# Altium footprint library hphonglib.PcbLib: 1250 footprints (part 54 of 79)
Each footprint in its own frame and in the unit in brackets; x right, y up, seen from the top. Pads: shape width x height; smd on the part's side, far side on the other; paste and mask are expansions set on the pad; w line width, h text height; cw(c..) or ccw(c..) is an arc to the next point about the centre after c.
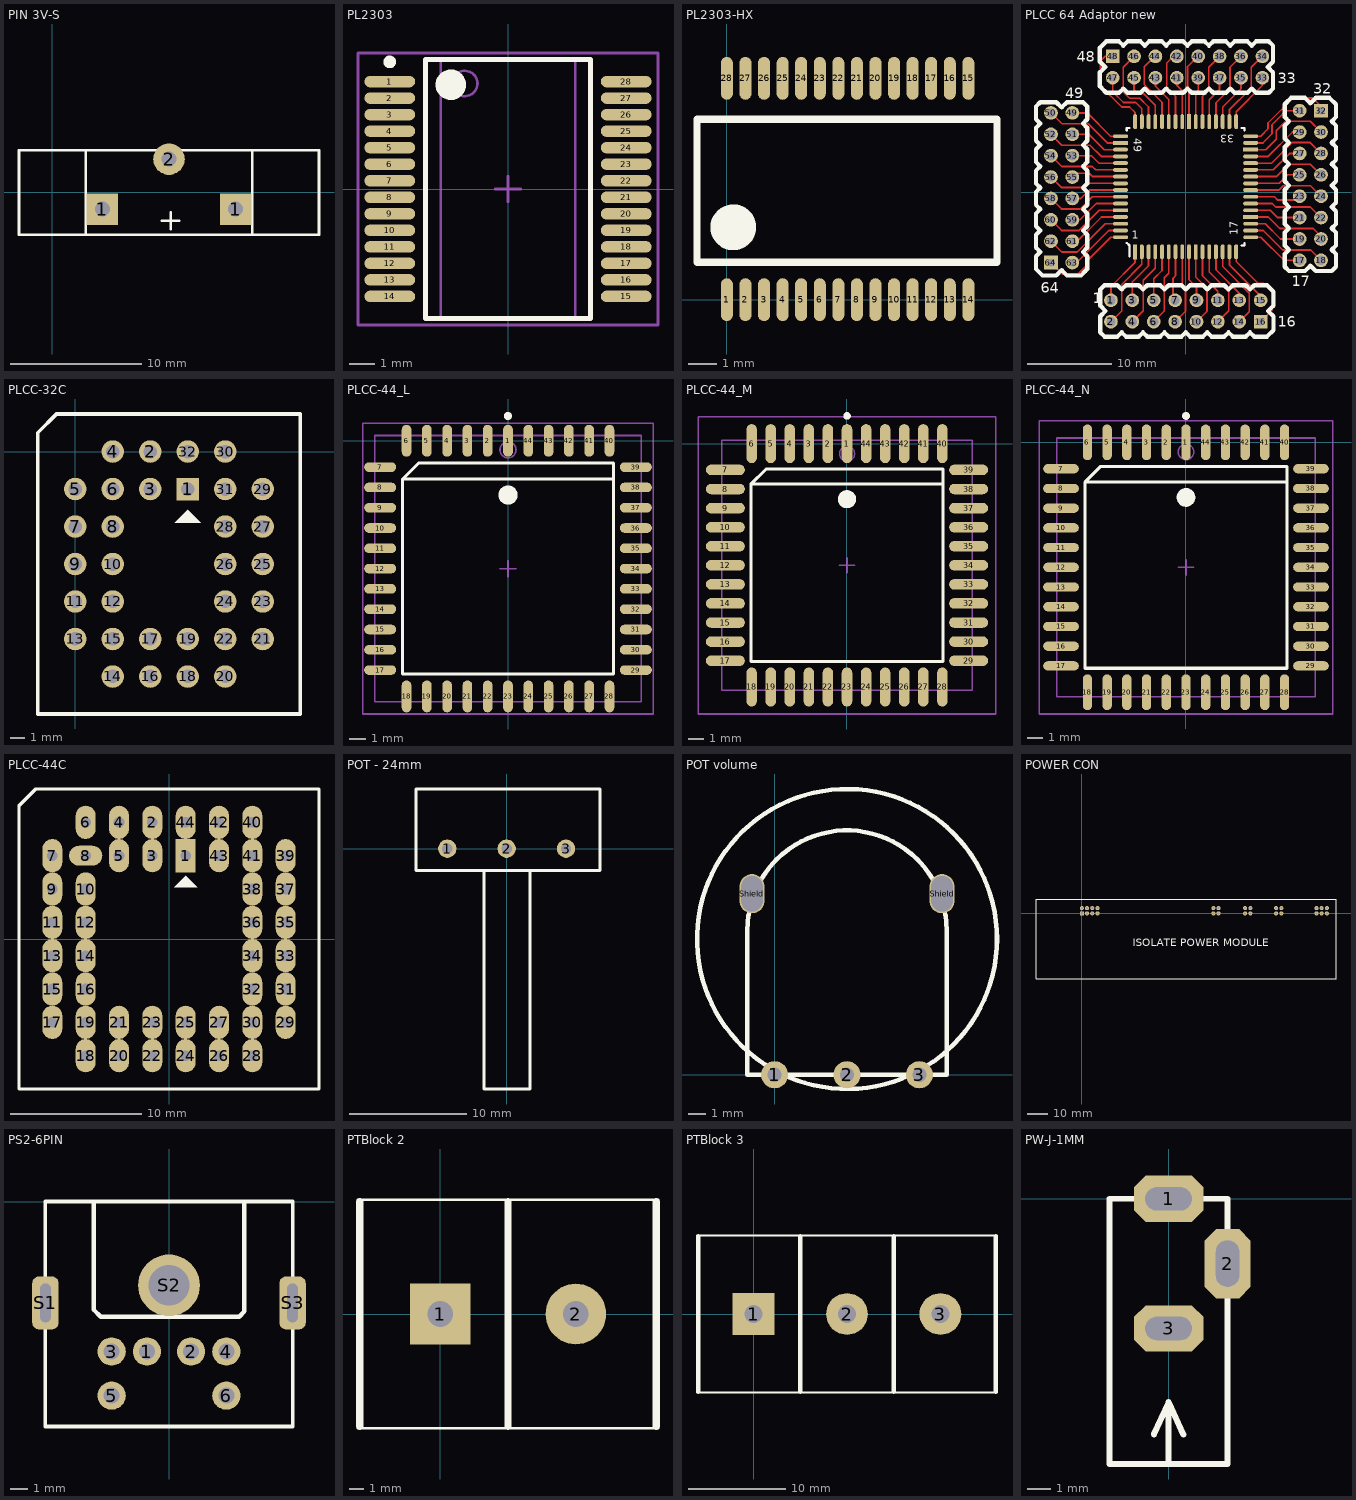
[diagram p53: the footprints below, top view; thin cyan lines are the x and y axes]

## PIN 3V-S [mil] "Socket PIN 3V"
pads (3):
  rect 95x95 hole 45: 1(150,-50) 1(550,-50)
  round 95 hole 45: 2(350,100)
Top Overlay:
  lines w8: 100,-127 100,127 ; 329,-85 380,-85 ; 355,-110 355,-60 ; 600,-127 600,127 ; -100,-127 800,-127 800,127 -100,127 -100,-127

## PL2303 [mm] "SOP, 28-Leads, Body 10,2x5,3mm (max), Pitch 0,65mm, IPC Medium Density"
height 2
pads (28):
  oval 2x0.45 smd: 1(-4.65,4.225) 2(-4.65,3.575) 3(-4.65,2.925) 4(-4.65,2.275) 5(-4.65,1.625) 6(-4.65,0.975) 7(-4.65,0.325) 8(-4.65,-0.325) 9(-4.65,-0.975) 10(-4.65,-1.625) 11(-4.65,-2.275) 12(-4.65,-2.925) 13(-4.65,-3.575) 14(-4.65,-4.225) 15(4.65,-4.225) 16(4.65,-3.575) 17(4.65,-2.925) 18(4.65,-2.275) 19(4.65,-1.625) 20(4.65,-0.975) 21(4.65,-0.325) 22(4.65,0.325) 23(4.65,0.975) 24(4.65,1.625) 25(4.65,2.275) 26(4.65,2.925) 27(4.65,3.575) 28(4.65,4.225)
Top Overlay:
  circle w0.25: c-4.65,5 r0.125
  circle w0.6: c-2.25,4.1 r0.3
  lines w0.2: -3.25,-5.1 -3.25,5.1 3.25,5.1 3.25,-5.1 -3.25,-5.1
Mechanical 13:
  circle w0.1: c-1.7,4.15 r0.5
  lines w0.1: -2.65,-5.1 -2.65,5.1 2.65,5.1 2.65,-5.1 -2.65,-5.1
Mechanical 15:
  lines w0.1: -0.5,0 0.5,0 ; 0,-0.5 0,0.5 ; -5.9,-5.35 -5.9,5.35 5.9,5.35 5.9,-5.35 -5.9,-5.35
3D body: height 2, standoff 0.25, extent -2.65,-5.1 2.65,5.1

## PL2303-HX [mil]
pads (28):
  oval 16.53x59.03 smd mask+7.9: 1(0,0) 2(25.6,0) 3(51.18,0) 4(76.78,0) 5(102.37,0) 6(127.97,0) 7(153.57,0) 8(179.15,0) 9(204.75,0) 10(230.35,0) 11(255.93,0) 12(281.53,0) 13(307.12,0) 14(332.7,0) 15(332.7,305) 16(307.12,305) 17(281.53,305) 18(255.93,305) 19(230.35,305) 20(204.75,305) 21(179.15,305) 22(153.57,305) 23(127.97,305) 24(102.37,305) 25(76.78,305) 26(51.18,305) 27(25.6,305) 28(0,305)
Top Overlay:
  circle w39.37: c8.8,99.7 r11.88
  lines w10: -41.22,51.66 -41.22,248.53 372.21,248.53 372.21,51.66 -41.22,51.66
3D body "SOP65P770x200-28N.step": height 84.65, standoff 0, extent -37.01,0.01 369.69,305.35

## PLCC 64 Adaptor new [mil]
pads (128):
  round 64 / inner round 60 / far side round 64 hole 43.3 mask+10: 1(-350.73,-505.37) 2(-350.73,-605.37) 3(-250.73,-505.37) 4(-250.73,-605.37) 5(-150.73,-505.37) 6(-150.73,-605.37) 7(-50.73,-505.37) 8(-50.73,-605.37) 9(49.27,-505.37) 10(49.27,-605.37) 11(149.27,-505.37) 17(531.7,-318.7) 18(631.7,-318.7) 19(531.7,-218.7) 20(631.7,-218.7) 21(531.7,-118.7) 22(631.7,-118.7) 23(531.7,-18.7) 24(631.7,-18.7) 25(531.7,81.3) 26(631.7,81.3) 33(357.37,535.37) 34(357.37,635.37) 35(257.37,535.37) 36(257.37,635.37) 37(157.37,535.37) 38(157.37,635.37) 39(57.37,535.37) 40(57.37,635.37) 41(-42.63,535.37) 42(-42.63,635.37) 43(-142.63,535.37) 50(-631.23,370.9) 51(-531.23,270.9) 52(-631.23,270.9) 53(-531.23,170.9) 54(-631.23,170.9) 55(-531.23,70.9) 56(-631.23,70.9) 57(-531.23,-29.1) 58(-631.23,-29.1) 59(-531.23,-129.1)
  rect 18x70 smd: 1(-237.8,-278.53) 10(45.7,-278.53) 40(14.2,329.97)
  oval 18x70 smd: 2(-206.3,-278.53) 3(-174.8,-278.53) 4(-143.3,-278.53) 5(-111.8,-278.53) 6(-80.3,-278.53) 7(-48.8,-278.53) 8(-17.3,-278.53) 9(14.2,-278.53) 11(77.2,-278.53) 12(108.7,-278.53) 13(140.2,-278.53) 14(171.7,-278.53) 15(203.2,-278.53) 16(234.7,-278.53) 33(234.7,329.97) 34(203.2,329.97) 35(171.7,329.97) 36(140.2,329.97) 37(108.7,329.97) 38(77.2,329.97) 39(45.7,329.97) 41(-17.3,329.97) 42(-48.8,329.97) 43(-80.3,329.97) 44(-111.8,329.97) 45(-143.3,329.97) 46(-174.8,329.97) 47(-206.3,329.97) 48(-237.8,329.97)
  round 64 / inner round 60 / far side round 64 hole 35.43 mask+10: 12(149.27,-605.37) 13(249.27,-505.37) 14(249.27,-605.37) 15(349.27,-505.37) 27(531.7,181.3) 28(631.7,181.3) 29(531.7,281.3) 30(631.7,281.3) 31(531.7,381.3) 44(-142.63,635.37) 45(-242.63,535.37) 46(-242.63,635.37) 47(-342.63,535.37) 49(-531.23,370.9) 60(-631.23,-129.1) 61(-531.23,-229.1) 62(-631.23,-229.1) 63(-531.23,-329.1)
  rect 64x64 hole 35.43 mask+10: 16(349.27,-605.37) 32(631.7,381.3) 48(-342.63,635.37) 64(-631.23,-329.1)
  oval 70x18 smd: 17(302.7,-210.53) 18(302.7,-179.03) 19(302.7,-147.53) 21(302.7,-84.53) 22(302.7,-53.03) 23(302.7,-21.53) 24(302.7,9.97) 25(302.7,41.47) 26(302.7,72.97) 27(302.7,104.47) 28(302.7,135.97) 29(302.7,167.47) 31(302.7,230.47) 32(302.7,261.97) 49(-305.8,261.97) 51(-305.8,198.97) 52(-305.8,167.47) 53(-305.8,135.97) 54(-305.8,104.47) 55(-305.8,72.97) 56(-305.8,41.47) 57(-305.8,9.97) 58(-305.8,-21.53) 59(-305.8,-53.03) 61(-305.8,-116.03) 62(-305.8,-147.53) 63(-305.8,-179.03) 64(-305.8,-210.53)
  rect 70x18 smd: 20(302.7,-116.03) 30(302.7,198.97) 50(-305.8,230.47) 60(-305.8,-84.53)
Top Layer:
  lines w8: -631.23,-329.1 -578.2,-382.13 -504.2,-382.13 -461.03,-338.97 -461.03,-320.47 -351.1,-210.53 -305.8,-210.53 ; -631.23,-229.1 -580.57,-279.77 -509.13,-279.77 -376.9,-147.53 -305.8,-147.53 ; -631.23,-129.1 -581.7,-178.63 -499.27,-178.63 -405.17,-84.53 -305.8,-84.53 ; -631.23,-29.1 -581.6,-78.73 -495.57,-78.73 -438.37,-21.53 -305.8,-21.53 ; -631.23,70.9 -582.73,22.4 -482.6,22.4 -463.53,41.47 -446.8,41.47 -305.8,41.47 ; -631.23,170.9 -580.33,120 -437.77,120 -422.23,104.47 -305.8,104.47 ; -631.23,270.9 -580.07,219.73 -448.7,219.73 -396.43,167.47 -305.8,167.47 ; -631.23,370.9 -579.97,319.63 -457.33,319.63 -368.17,230.47 -305.8,230.47 ; -531.23,-329.1 -511.6,-329.1 -361.53,-179.03 -305.8,-179.03 ; -531.23,-229.1 -507.8,-229.1 -394.73,-116.03 -305.8,-116.03 ; -531.23,-129.1 -495.37,-129.1 -419.3,-53.03 -305.8,-53.03 ; -531.23,-29.1 -491.57,-29.1 -452.5,9.97 -305.8,9.97 ; -531.23,70.9 -513.13,89 -452.4,89 -436.37,72.97 -305.8,72.97 ; -531.23,170.9 -441.8,170.9 -406.87,135.97 -305.8,135.97 ; -531.23,270.9 -454.23,270.9 -382.3,198.97 -305.8,198.97 ; -531.23,370.9 -461.73,370.9 -352.8,261.97 -305.8,261.97 ; -350.73,-605.37 -300.7,-555.33 -300.7,-431.47 -206.3,-337.07 -206.3,-278.53 ; -350.73,-505.37 -350.73,-440.8 -237.8,-327.87 -237.8,-278.53 ; -342.63,535.37 -342.63,470.1 -292.07,419.53 -234.1,419.53 -206.3,391.73 -206.3,329.97 ; -342.63,635.37 -377.17,635.37 -400,612.53 -400,573.72 -400,523.15 -400,497.87 -300.7,398.57 -263.7,398.57 -237.8,372.67 -237.8,329.97 ; -250.73,-605.37 -200,-554.63 -200,-412.17 -143.3,-355.47 -143.3,-278.53 ; -250.73,-505.37 -250.73,-419.73 -174.8,-343.8 -174.8,-278.53 ; -242.63,535.37 -242.63,478.63 -224.23,460.23 -197.1,460.23 -143.3,406.43 -143.3,329.97 ; -174.8,329.97 -174.8,398.47 -215.6,439.27 -263.7,439.27 -293.3,468.87 -293.3,584.8 -242.73,635.37 -242.71,635.37 -242.66,635.37 ; -150.73,-605.37 -100.9,-555.53 -100.9,-399.4 -80.3,-378.8 -80.3,-278.53 ; -150.73,-505.37 -150.73,-404.83 -111.8,-365.9 -111.8,-278.53 ; -142.63,535.37 -142.63,495.8 -80.3,433.47 -80.3,329.97 ; -142.63,635.37 -146.53,635.37 -195,586.9 -195,503.77 -111.8,420.57 -111.8,329.97 ; -50.73,-605.37 -2.23,-556.87 -2.23,-453.67 -17.3,-438.6 -17.3,-399.98 -17.3,-395.97 -17.3,-278.53 ; -50.73,-505.37 -60.2,-495.9 -60.2,-401.87 -48.8,-390.47 -48.8,-278.53 ; -48.8,329.97 -48.8,448.83 -90,490.03 -90,604.33 -58.97,635.37 -42.63,635.37 ; -42.63,535.37 -42.63,499.4 -17.3,474.07 -17.3,329.97 ; 14.2,-278.53 14.2,-409.67 49.27,-444.73 49.27,-505.37 ; 14.2,329.97 14.2,480.8 7.5,487.5 7.5,587.5 57.37,637.37 ; 45.7,-278.53 45.7,-396.77 98.9,-449.97 98.9,-555.73 49.27,-605.37 ; 45.7,329.97 45.7,463.77 56.97,475.03 56.97,534.97 57.37,535.37 ; 77.2,-278.53 77.2,-391.27 149.27,-463.33 149.27,-505.37 ; 77.2,329.97 77.2,448.4 105,476.2 ; 106,477.2 106,584 157.37,635.37 ; 108.7,-278.53 108.7,-373.43 200.03,-464.77 200.03,-554.6 149.27,-605.37 ; 108.7,329.97 108.7,433.03 157.37,481.7 157.37,535.37 ; 140.2,-278.53 140.2,-363 249.27,-472.07 249.27,-505.37 ; 140.2,329.97 140.2,417.67 206.2,483.67 206.2,584.2 257.37,635.37 ; 171.7,-278.53 171.7,-347.63 296.23,-472.17 296.23,-558.4 249.27,-605.37 ; 171.7,329.97 171.7,398.6 257.37,484.27 257.37,535.37 ; 203.2,-278.53 203.2,-339.67 349.27,-485.73 349.27,-505.37 ; 203.2,329.97 203.2,385.7 302.4,484.9 306,488.5 306,584 357.37,635.37 ; 234.7,-278.53 234.7,-324.3 336.93,-426.53 362.83,-426.53 402.3,-466 402.3,-552.33 349.27,-605.37 ; 234.7,329.97 234.7,376.5 357.37,499.17 357.37,535.37 ; 302.7,-210.53 350.33,-210.53 458.5,-318.7 531.7,-318.7 ; 302.7,-179.03 362,-179.03 452.97,-270 583,-270 631.7,-318.7 ; 302.7,-147.53 371.2,-147.53 442.37,-218.7 531.7,-218.7 ; 302.7,-116.03 384.1,-116.03 438.07,-170 594.7,-170 631.7,-207 ; 302.7,-84.53 394.53,-84.53 428.7,-118.7 531.7,-118.7 ; 302.7,-53.03 403.73,-53.03 419.57,-68.87 581.87,-68.87 631.7,-118.7 ; 302.7,-21.53 414.17,-21.53 429.43,-36.8 513.6,-36.8 531.7,-18.7 ; 302.7,9.97 434.47,9.97 454.5,30 582.17,30 630.87,-18.7 ; 302.7,41.47 436.17,41.47 476,81.3 531.7,81.3 ; 302.7,72.97 422.03,72.97 480,130.93 582.07,130.93 631.7,81.3 ; 302.7,104.47 407.9,104.47 484.73,181.3 531.7,181.3 ; 302.7,135.97 399.93,135.97 496.03,232.07 580.93,232.07 631.7,181.3 ; 302.7,167.47 384.57,167.47 498.4,281.3 531.7,281.3 ; 302.7,198.97 372.9,198.97 422.03,248.1 422.03,287.57 466.43,331.97 581.03,331.97 631.7,281.3 ; 302.7,230.47 360,230.47 402.3,272.77 402.3,315.93 467.67,381.3 531.7,381.3 ; 302.7,261.97 349.57,261.97 383.8,296.2 383.8,323.33 500.97,440.5 593.47,440.5 631.7,402.27 ; -242.66,635.37 -242.63,635.37
Top Overlay:
  drawing of 344 lines, arcs and shapes, not listed
  text "1" at -252.98,-217.45 h37.5
  text "17" at 241.53,-202.12 h37.5
  text "33" at 226.2,268.8 h37.5
  text "49" at -244.73,253.47 h37.5
  text ".Designator" at -170,35 h37.5
  text "48" at -510,610 h50
  text "33" at 430,510 h50
  text "17" at 495,-440 h50
  text "32" at 595,460 h50
  text "1" at -435,-520 h50
  text "16" at 430,-630 h50
  text "49" at -565,440 h50
  text "64" at -680,-470 h50
Mechanical 1:
  lines w10: -276.6,-236.83 -264.1,-249.33 -264.1,-299.33 ; -276.6,288.17 -276.6,300.67 -264.1,300.67 ; 260.9,-249.33 273.4,-249.33 273.4,-236.83 ; 260.9,300.67 273.4,300.67 273.4,288.17
  text "1" at -252.98,-217.45 h37.5
  text "17" at 241.53,-202.12 h37.5
  text "33" at 226.2,268.8 h37.5
  text "49" at -244.73,253.47 h37.5

## PLCC-32C [mil] "Socket PLCC32R"
height 200
pads (32):
  rect 60x60 hole 36: 1(300,-100)
  round 60 hole 36: 2(200,0) 3(200,-100) 4(100,0) 5(0,-100) 6(100,-100) 7(0,-200) 8(100,-200) 9(0,-300) 10(100,-300) 11(0,-400) 12(100,-400) 13(0,-500) 14(100,-600) 15(100,-500) 16(200,-600) 17(200,-500) 18(300,-600) 19(300,-500) 20(400,-600) 21(500,-500) 22(400,-500) 23(500,-400) 24(400,-400) 25(500,-300) 26(400,-300) 27(500,-200) 28(400,-200) 29(500,-100) 30(400,0) 31(400,-100) 32(300,0)
Top Overlay:
  region: 300,-155 265,-190 335,-190
  lines w10: -100,-700 -100,50 -50,100 600,100 600,-700 -100,-700

## PLCC-44_L [mm] "Leaded Chip Carrier, 44-Leads, Body 16.6x16.6mm, Pitch 1.27mm, IPC High Density"
height 4.58
pads (44):
  oval 0.6x2 smd: 1(0,0) 2(-1.27,0) 3(-2.54,0) 4(-3.81,0) 5(-5.08,0) 6(-6.35,0) 18(-6.35,-16) 19(-5.08,-16) 20(-3.81,-16) 21(-2.54,-16) 22(-1.27,-16) 23(0,-16) 24(1.27,-16) 25(2.54,-16) 26(3.81,-16) 27(5.08,-16) 28(6.35,-16) 40(6.35,0) 41(5.08,0) 42(3.81,0) 43(2.54,0) 44(1.27,0)
  oval 2x0.6 smd: 7(-8,-1.65) 8(-8,-2.92) 9(-8,-4.19) 10(-8,-5.46) 11(-8,-6.73) 12(-8,-8) 13(-8,-9.27) 14(-8,-10.54) 15(-8,-11.81) 16(-8,-13.08) 17(-8,-14.35) 29(8,-14.35) 30(8,-13.08) 31(8,-11.81) 32(8,-10.54) 33(8,-9.27) 34(8,-8) 35(8,-6.73) 36(8,-5.46) 37(8,-4.19) 38(8,-2.92) 39(8,-1.65)
Top Overlay:
  circle w0.6: c0,-3.4 r0.3
  circle w0.25: c0,1.55 r0.125
  lines w0.2: 6.6,-2.4 -6.6,-2.4 ; -6.6,-2.4 -6.6,-14.6 6.6,-14.6 6.6,-1.4 -5.6,-1.4 -6.6,-2.4
Mechanical 13:
  circle w0.1: c0,-0.57 r0.5
  lines w0.1: -8.33,-16.33 8.33,-16.33 8.33,0.33 -8.33,0.33 -8.33,-16.33
Mechanical 15:
  lines w0.1: -0.5,-8 0.5,-8 ; 0,-8.5 0,-7.5 ; -9.1,-17.1 9.1,-17.1 9.1,1.1 -9.1,1.1 -9.1,-17.1
3D body: height 4.58, standoff 0, extent -8.33,-16.33 8.33,0.33

## PLCC-44_M [mm] "Leaded Chip Carrier, 44-Leads, Body 16.6x16.6mm, Pitch 1.27mm, IPC Low Density"
height 4.58
pads (44):
  oval 0.7x2.6 smd: 1(0,0) 2(-1.27,0) 3(-2.54,0) 4(-3.81,0) 5(-5.08,0) 6(-6.35,0) 18(-6.35,-16.2) 19(-5.08,-16.2) 20(-3.81,-16.2) 21(-2.54,-16.2) 22(-1.27,-16.2) 23(0,-16.2) 24(1.27,-16.2) 25(2.54,-16.2) 26(3.81,-16.2) 27(5.08,-16.2) 28(6.35,-16.2) 40(6.35,0) 41(5.08,0) 42(3.81,0) 43(2.54,0) 44(1.27,0)
  oval 2.6x0.7 smd: 7(-8.1,-1.75) 8(-8.1,-3.02) 9(-8.1,-4.29) 10(-8.1,-5.56) 11(-8.1,-6.83) 12(-8.1,-8.1) 13(-8.1,-9.37) 14(-8.1,-10.64) 15(-8.1,-11.91) 16(-8.1,-13.18) 17(-8.1,-14.45) 29(8.1,-14.45) 30(8.1,-13.18) 31(8.1,-11.91) 32(8.1,-10.64) 33(8.1,-9.37) 34(8.1,-8.1) 35(8.1,-6.83) 36(8.1,-5.56) 37(8.1,-4.29) 38(8.1,-3.02) 39(8.1,-1.75)
Top Overlay:
  circle w0.25: c0,1.85 r0.125
  circle w0.6: c0,-3.7 r0.3
  lines w0.2: 6.4,-2.7 -6.4,-2.7 ; -6.4,-2.7 -5.4,-1.7 6.4,-1.7 6.4,-14.5 -6.4,-14.5 -6.4,-2.7
Mechanical 13:
  circle w0.1: c0,-0.67 r0.5
  lines w0.1: -8.33,-16.43 -8.33,0.23 8.33,0.23 8.33,-16.43 -8.33,-16.43
Mechanical 15:
  lines w0.1: -0.5,-8.1 0.5,-8.1 ; 0,-8.6 0,-7.6 ; -9.9,-18 -9.9,1.8 9.9,1.8 9.9,-18 -9.9,-18
3D body: height 4.58, standoff 0, extent -8.33,-16.43 8.33,0.23

## PLCC-44_N [mm] "Leaded Chip Carrier, 44-Leads, Body 16.6x16.6mm, Pitch 1.27mm, IPC Medium Density"
height 4.58
pads (44):
  oval 0.6x2.3 smd: 1(0,0) 2(-1.27,0) 3(-2.54,0) 4(-3.81,0) 5(-5.08,0) 6(-6.35,0) 18(-6.35,-16.1) 19(-5.08,-16.1) 20(-3.81,-16.1) 21(-2.54,-16.1) 22(-1.27,-16.1) 23(0,-16.1) 24(1.27,-16.1) 25(2.54,-16.1) 26(3.81,-16.1) 27(5.08,-16.1) 28(6.35,-16.1) 40(6.35,0) 41(5.08,0) 42(3.81,0) 43(2.54,0) 44(1.27,0)
  oval 2.3x0.6 smd: 7(-8.05,-1.7) 8(-8.05,-2.97) 9(-8.05,-4.24) 10(-8.05,-5.51) 11(-8.05,-6.78) 12(-8.05,-8.05) 13(-8.05,-9.32) 14(-8.05,-10.59) 15(-8.05,-11.86) 16(-8.05,-13.13) 17(-8.05,-14.4) 29(8.05,-14.4) 30(8.05,-13.13) 31(8.05,-11.86) 32(8.05,-10.59) 33(8.05,-9.32) 34(8.05,-8.05) 35(8.05,-6.78) 36(8.05,-5.51) 37(8.05,-4.24) 38(8.05,-2.97) 39(8.05,-1.7)
Top Overlay:
  circle w0.6: c0,-3.55 r0.3
  circle w0.25: c0,1.7 r0.125
  lines w0.2: 6.5,-2.55 -6.5,-2.55 ; -6.5,-2.55 -6.5,-14.55 6.5,-14.55 6.5,-1.55 -5.5,-1.55 -6.5,-2.55
Mechanical 13:
  circle w0.1: c0,-0.62 r0.5
  lines w0.1: -8.33,-16.38 8.33,-16.38 8.33,0.28 -8.33,0.28 -8.33,-16.38
Mechanical 15:
  lines w0.1: -0.5,-8.05 0.5,-8.05 ; 0,-8.55 0,-7.55 ; -9.45,-17.5 9.45,-17.5 9.45,1.4 -9.45,1.4 -9.45,-17.5
3D body: height 4.58, standoff 0, extent -8.33,-16.38 8.33,0.28

## PLCC-44C [mil] "QPC-44C"
height 200
pads (44):
  rect 60x100 hole 32: 1(50,250)
  oval 60x100 hole 32: 2(-50,350) 3(-50,250) 4(-150,350) 5(-150,250) 6(-250,350) 7(-350,250) 9(-350,150) 10(-250,150) 11(-350,50) 12(-250,50) 13(-350,-50) 14(-250,-50) 15(-350,-150) 16(-250,-150) 17(-350,-250) 18(-250,-350) 19(-250,-250) 20(-150,-350) 21(-150,-250) 22(-50,-350) 23(-50,-250) 24(50,-350) 25(50,-250) 26(150,-350) 27(150,-250) 28(250,-350) 29(350,-250) 30(250,-250) 31(350,-150) 32(250,-150) 33(350,-50) 34(250,-50) 35(350,50) 36(250,50) 37(350,150) 38(250,150) 39(350,250) 40(250,350) 41(250,250) 42(150,350) 43(150,250) 44(50,350)
  oval 100x60 hole 32: 8(-250,250)
Top Overlay:
  region: 50,190 15,155 85,155
  lines w10: -450,-450 -450,400 -400,450 450,450 450,-450 -450,-450

## POT - 24mm [mil]
pads (3):
  round 62 hole 35: 1(-200,0) 2(0,0) 3(200,0)
Top Overlay:
  lines w10: -77,-73 -77,-810 79,-810 79,-73 ; -305,-73 -305,201 314,201 314,-73 -305,-73
3D body "POT2.STEP": height 811.87, standoff -157.48, extent -308,-808.11 312,198.11

## POT volume [mm] "POT volume"
pads (5):
  round 1.524 hole 0.8: 1(0,0) 2(4.064,0) 3(8.128,0)
  oval 1.4x2.2 hole 1.2 slot 2 at 90 deg: Shield(-1.27,10.16) Shield(9.398,10.16)
Top Overlay:
  circle w0.254: c4.064,7.62 r8.418
  lines w0.254: -1.524,0 -1.524,8.128 cw(c4.064,8.128) 9.652,8.128 9.652,0 -1.524,0
3D body: height 2.51, standoff 1.5, extent 3.3,6.85 4.825,8.4
3D body: height 2.51, standoff 1.5, extent 2.525,6.1 5.575,9.125
3D body: height 3.5, standoff 2.5, extent -4.375,-0.75 12.45,7.675
3D body: height 3.5, standoff 2.5, extent -4.35,7.575 12.475,16
3D body: height 2.5, standoff 1.5, extent -4.35,-0.825 12.475,16.05
3D body: height 1, standoff 0.5, extent -1.55,-0.025 9.625,13.75

## POWER CON [mm]
pads (26):
  rect 2.032x2.032 hole 1.143: 1(0,0)
  round 2 hole 1: 2(2.54,0) 3(5.08,0) 4(7.62,0) 5(64.135,0) 6(66.675,0) 7(79.629,0) 8(82.169,0) 9(94.742,0) 10(97.282,0) 11(114.427,0) 12(116.967,0) 13(119.507,0) 14(119.507,2.54) 15(116.967,2.54) 16(114.427,2.54) 17(97.282,2.54) 18(94.742,2.54) 19(82.169,2.54) 20(79.629,2.54) 21(66.675,2.54) 22(64.135,2.54) 23(7.62,2.54) 24(5.08,2.54) 25(2.54,2.54) 26(0,2.54)
Top Overlay:
  lines w0.508: -22.352,-31.877 -5.461,-31.877 123.952,-31.877 123.952,6.858 121.666,6.858 -1.905,6.858 -22.352,6.858 -22.352,-31.877
  text "ISOLATE POWER MODULE" at 24.765,-17.272 h6.35

## PS2-6PIN [mm] "PS2 Socket, 6 Pin, Through Hole"
pads (9):
  round 1.6 hole 0.9: 1(-1.25,-8.5) 2(1.25,-8.5) 3(-3.25,-8.5) 4(3.25,-8.5) 5(-3.25,-11) 6(3.25,-11)
  rrect50% 1.5x3 hole 0.6 slot 2.2 at 90 deg: S1(-7,-5.75) S3(7,-5.75)
  round 3.5 hole 2.3: S2(0,-4.75)
Top Overlay:
  lines w0.2: -7,-12.75 7,-12.75 7,0 -7,0 -7,-12.75
  lines w0.254: -4.275,0 -4.275,-6.125 -3.875,-6.525 3.975,-6.525 4.275,-6.225 4.275,0
  lines w0.8: -7,-6.477 -7,-5.004 ; 7,-6.502 7,-4.928
Bottom Overlay:
  lines w0.1: -7.01,-4.191 -6.96,-4.191 -6.96,0 7.01,0 7.01,-4.191 ; -6.985,-7.366 -6.985,-12.725 7.01,-12.725 7.01,-7.366

## PTBlock 2 [mil] "Connector; Terminal; Power; 2 Positions; Solder Pad 35mil"
pads (2):
  rect 170x170 hole 72: 1(0,0)
  round 170 hole 72: 2(380,0)
Top Overlay:
  lines w7.87: -230,-320 610,-320 ; -230,320 610,320
  lines w20: -225,-315 -225,315 ; 190,-315 190,315 ; 605,-315 605,315
3D body: height 287.4, standoff 255.91, extent 253,-118 513,118
3D body: height 255.91, standoff 236.22, extent 316,118.22 451,189.22
3D body: height 255.91, standoff 236.22, extent 253,-118 513,118
3D body: height 366.14, standoff 326.77, extent 282.57,-103.34 483.43,-20.7
3D body: height 366.14, standoff 326.77, extent 283.57,18.7 484.43,101.34
3D body: height 326.77, standoff 287.4, extent 280.66,-103.34 485.34,101.34
3D body: height 326.77, standoff 287.4, extent -105.34,-105.34 99.34,99.34
3D body: height 366.14, standoff 326.77, extent -102.43,16.7 98.43,99.34
3D body: height 366.14, standoff 326.77, extent -103.43,-105.34 97.43,-22.7
3D body: height 255.91, standoff 236.22, extent -133,-120 127,116
3D body: height 255.91, standoff 236.22, extent -70,116.22 65,187.22
3D body: height 287.4, standoff 255.91, extent -133,-120 127,116
3D body: height 255.91, standoff 236.22, extent 316,-189 451,-118
3D body: height 255.91, standoff 236.22, extent -70,-191 65,-120
3D body: height 255.91, standoff -39.37, extent -25,-25 25,25
3D body: height 236.22, standoff 0, extent -234.75,-315 615,315
3D body: height 472.44, standoff 0, extent 170.34,-324 209.66,324
3D body: height 472.44, standoff 0, extent 585.34,-324 624.66,324
3D body: height 255.91, standoff -39.37, extent 356,-25 406,25
3D body: height 472.44, standoff 0, extent -244.66,-324 -205.34,324

## PTBlock 3 [mil] "Connector; Terminal; Power; 3 Positions; Solder Pad 35mil"
pads (3):
  rect 170x170 hole 72: 1(0,0)
  round 170 hole 72: 2(380,0) 3(760,0)
Top Overlay:
  lines w7.87: -230,-320 990,-320 ; -230,320 990,320
  lines w20: -225,-315 -225,315 ; 190,-315 190,315 ; 570,-315 570,315 ; 985,-315 985,315
3D body "User Library-0387206303.STEP": height 661, standoff -189, extent -229.99,-310.52 980.01,309.48

## PW-J-1MM [mm] "Power Header 1mm"
pads (3):
  oct 3x2 hole 1 slot 2 at 0 deg paste+1: 1(0,0) 3(0,-5.588)
  oct 2x3 hole 1 slot 2 at 90 deg paste+1: 2(2.54,-2.794)
Top Overlay:
  lines w0.254: -0.635,-10.16 0,-8.763 ; 0,-11.43 0,-8.763 ; 0.635,-10.16 0,-8.763 ; -2.54,-11.43 -2.54,0 2.54,0 2.54,-11.43 -2.54,-11.43